# Altium footprint library PcbLib_Smart_Switchboard.PcbLib: 39 footprints (part 1 of 3)
Each footprint in its own frame and in the unit in brackets; x right, y up, seen from the top. Pads: shape width x height; smd on the part's side, far side on the other; paste and mask are expansions set on the pad; w line width, h text height; cw(c..) or ccw(c..) is an arc to the next point about the centre after c.
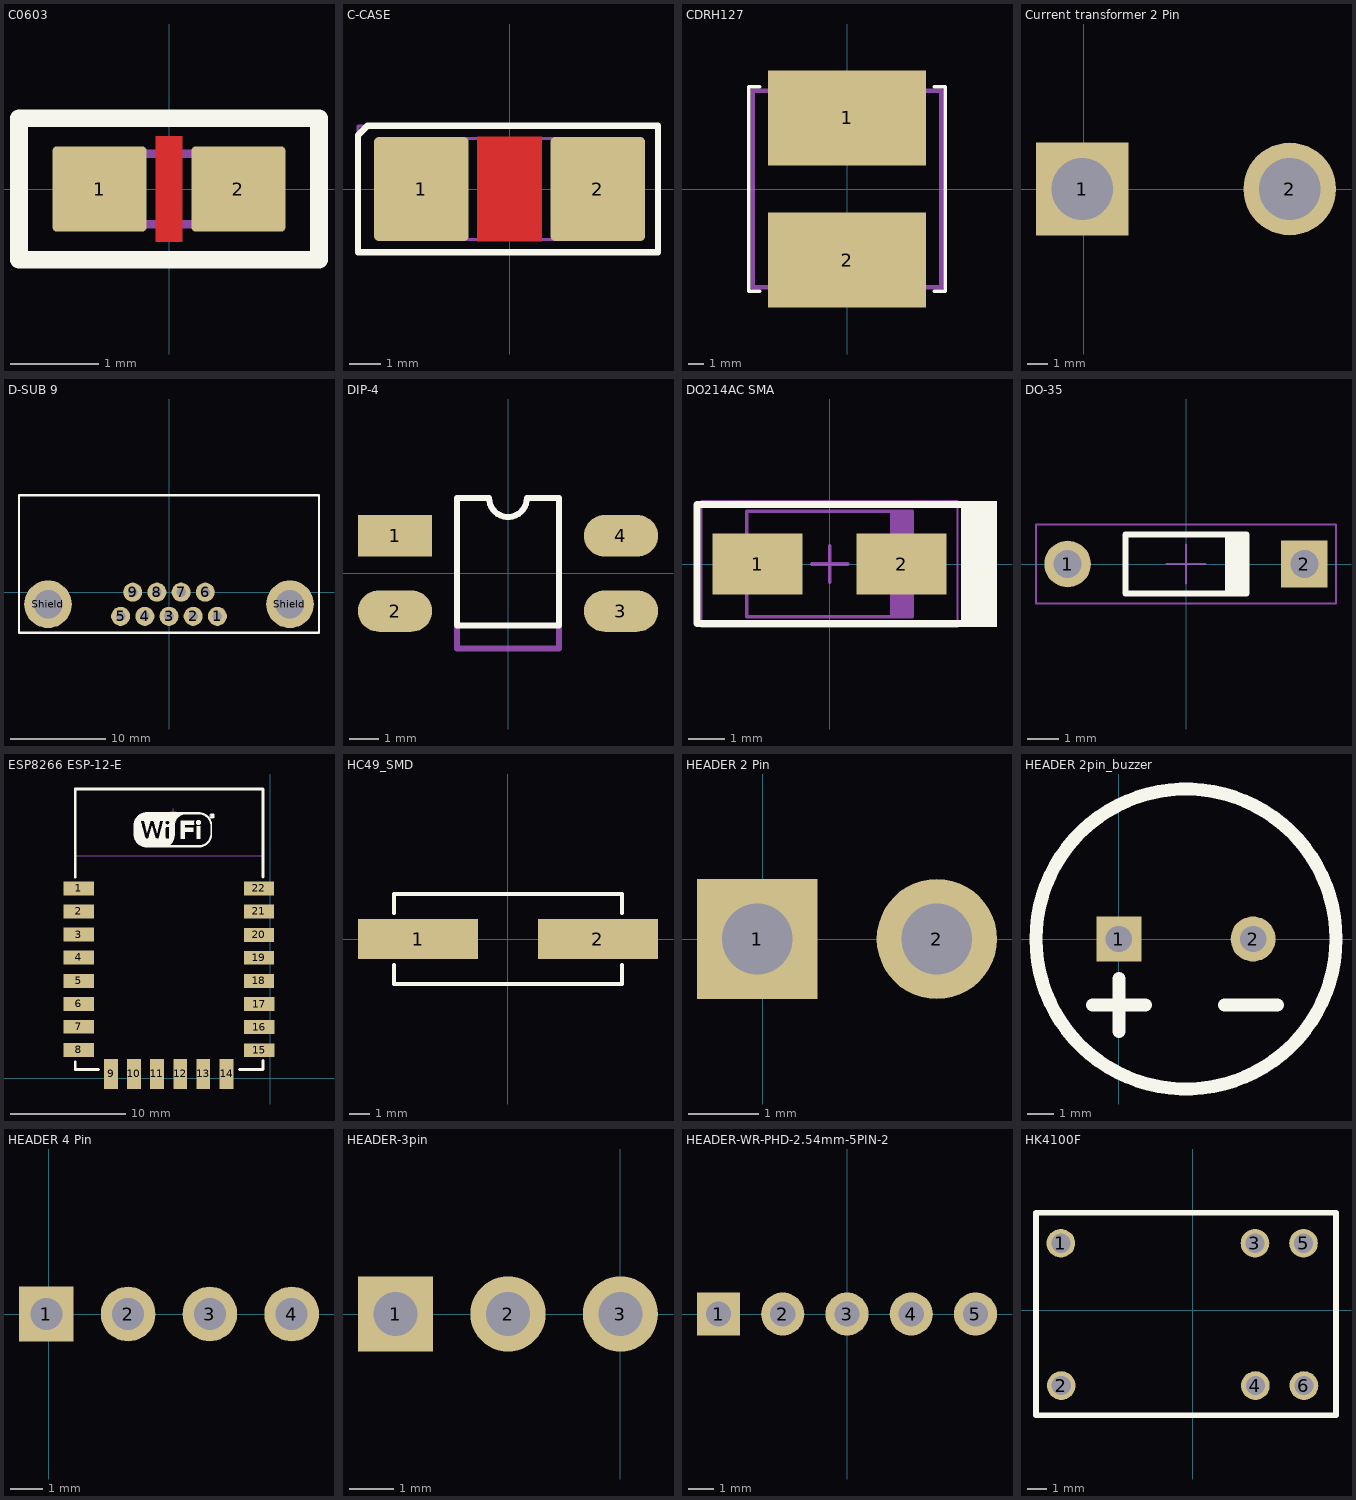
[diagram p0: the footprints below, top view; thin cyan lines are the x and y axes]

## C0603 [mil]
pads (2):
  rrect10% 42x38 smd: 1(-31,0) 2(31,0)
Top Layer:
  pour cut-out: 5.91,-23.62 5.91,23.62 -5.91,23.62 -5.91,-23.62
Top Overlay:
  lines w7.87: -66.93,-31.5 -66.93,31.5 66.93,31.5 66.93,-31.5 -66.93,-31.5
Mechanical 13:
  lines w3.94: -31.5,-15.75 31.5,-15.75 31.5,15.75 -31.5,15.75 -31.5,-15.75
Mechanical 15:
  lines w3.94: -66.93,-31.5 66.93,-31.5 66.93,31.5 -66.93,31.5 -66.93,-31.5
3D body "User Library-cap_0603-1.step": height 31.5, standoff 0, extent -31.49,-15.74 31.5,15.75

## C-CASE [mm]
pads (2):
  rrect10% 3x3.3 smd: 1(-2.794,0) 2(2.794,0)
Top Layer:
  pour cut-out: -1.025,1.65 -1.025,-1.65 1.025,-1.65 1.025,1.65
Top Overlay:
  lines w0.2: -4.8,-2 4.7,-2 4.7,2 -4.5,2 -4.8,1.7 -4.8,-2
Mechanical 13:
  lines w0.1: -2.3,-1.6 -2.3,1.6 ; -3,-1.6 3,-1.6 3,1.6 -3,1.6 -3,-1.6
Mechanical 15:
  lines w0.1: -4.8,-2 4.7,-2 4.7,2 -4.8,2 -4.8,-2
3D body "SW3dPS-cap_c.STEP": height 2.52, standoff 0.01, extent -2.997,-1.6 2.997,1.6

## CDRH127 [mm]
pads (2):
  rect 10x6 smd: 1(0,4.5) 2(0,-4.5)
Top Overlay:
  lines w0.2: -5.523,-6.477 -6.223,-6.477 -6.223,6.477 -5.523,6.477 ; 5.523,-6.477 6.223,-6.477 6.223,6.477 5.523,6.477
Mechanical 13:
  lines w0.3: -5.969,-6.223 -5.969,6.223 5.969,6.223 5.969,-6.223 -5.969,-6.223
  text ".Designator" at -4.572,-0.889 h2.5
3D body "SUMIDA-CDRH127-DEFAULT.STEP": height 7.5, standoff 0.05, extent -6,-6.171 6,6.171

## Current transformer 2 Pin [mm]
pads (2):
  rect 4.5x4.5 hole 3: 1(-0.08,0)
  round 4.5 hole 3: 2(10,0)

## D-SUB 9 [mm]
pads (11):
  round 2 hole 1: 1(5.08,-2.54) 2(2.54,-2.54) 3(0,-2.54) 4(-2.54,-2.54) 5(-5.08,-2.54) 6(3.81,0) 7(1.27,0) 8(-1.27,0) 9(-3.81,0)
  round 5 hole 3: Shield(-12.7,-1.27) Shield(12.7,-1.27)
Top Overlay:
  lines w0.254: -15.75,-4.25 -15.75,10.16 15.75,10.16 15.75,-4.25 -15.75,-4.25

## DIP-4 [mm]
pads (4):
  rect 2.5x1.4 smd: 1(-3.81,1.27)
  oval 2.5x1.4 smd: 2(-3.81,-1.27) 3(3.81,-1.27) 4(3.81,1.27)
Top Overlay:
  lines w0.2: -1.725,-1.75 -1.725,2.54 -0.635,2.54 ccw(c0,2.54) 0.635,2.54 1.725,2.54 1.725,-1.75 -1.725,-1.75
Mechanical 13:
  lines w0.2: -1.725,-2.54 -1.725,2.54 -0.635,2.54 ccw(c0,2.54) 0.635,2.54 1.725,2.54 1.725,-2.54 -1.725,-2.54
  text ".Designator" at -1.397,-0.762 h1.52
3D body "20590.stp": height 4.65, standoff -2.3, extent -4.4,-2.29 4.4,2.29

## DO214AC SMA [mm] "Molded Diode, 2-Leads, Body 4.30x2.60mm, IPC Medium Density"
height 2.4
pads (2):
  rect 2.5x1.7 smd: 1(-2,0) 2(2,0)
Top Overlay:
  rectangle: 3.65,-1.75 4.65,1.75
  lines w0.2: -3.683,1.175 -3.683,1.651 ; -3.683,1.651 3.75,1.651 3.75,0.254 3.75,-0.254 3.75,-1.651 -3.683,-1.651 -3.683,1.651
Mechanical 13:
  rectangle: 1.681,-1.46 2.3,1.46
  lines w0.1: -2.3,-1.46 -2.3,1.46 2.3,1.46 2.3,-1.46 -2.3,-1.46
Mechanical 15:
  lines w0.05: -3.556,-1.75 -3.556,1.75 3.556,1.75 3.556,-1.75 -3.556,-1.75
  lines w0.1: -0.5,0 0.5,0 ; 0,-0.5 0,0.5
3D body "SMA.STEP": height 2.4, standoff 0, extent -2.6,-1.375 2.6,1.375

## DO-35 [mm] "Diode, Axial; Body 3.8 x 1.9 mm (LxDia. max), Lead Dia. 0.53 mm (max)"
height 1.9
pads (2):
  round 1.5 hole 0.9: 1(-3.81,0)
  rect 1.5x1.5 hole 0.9: 2(3.81,0)
Top Overlay:
  rectangle: 1.25,-0.95 2.05,0.95
  lines w0.2: 1.95,-0.95 -1.95,-0.95 -1.95,0.95 1.95,0.95
Mechanical 15:
  lines w0.05: -0.635,0 0.635,0 ; 0,-0.635 0,0.635 ; -4.826,-1.27 -4.826,1.27 4.826,1.27 4.826,-1.27 -4.826,-1.27
3D body "User Library-DO-35.step": height 1.98, standoff -2.43, extent -4.09,-0.96 4.09,0.96

## ESP8266 ESP-12-E [mm] "ESP8266 ESP-12-E"
pads (22):
  rect 2.6x1.2 smd mask+0: 1(-16.586,16.408) 2(-16.586,14.427) 3(-16.586,12.421) 4(-16.586,10.439) 5(-16.586,8.407) 6(-16.586,6.426) 7(-16.586,4.445) 8(-16.586,2.438) 15(-0.965,2.413) 16(-0.965,4.42) 17(-0.965,6.401) 18(-0.991,8.407) 19(-0.991,10.414) 20(-0.991,12.395) 21(-0.991,14.427) 22(-0.991,16.408)
  rect 1.2x2.6 smd mask+0: 9(-13.792,0.356) 10(-11.811,0.356) 11(-9.83,0.356) 12(-7.798,0.356) 13(-5.817,0.356) 14(-3.785,0.356)
Top Overlay:
  drawing of 1267 lines, arcs and shapes, not listed
  text ".Designator" at -17.247,-2.134 h1
Mechanical 13:
  lines w0.051: -16.839,19.252 -0.583,19.252
  text "CUTOUT POLYGON" at -16.585,23.891 h0.25
  text "ANTENNA AREA" at -16.585,24.399 h0.25
Mechanical 15:
  lines w0.1: -8.661,23.061 -8.153,23.061 ; -8.407,22.807 -8.407,23.315
3D body "User Library-ESP_12_E.STEP": height 2.18, standoff -0.03, extent -16.789,0.929 -0.789,24.929

## HC49_SMD [mm]
height 4.5
pads (2):
  rect 6x2 smd: 1(-4.5,0) 2(4.5,0)
Top Overlay:
  lines w0.2: -5.7,-1.3 -5.7,-2.25 5.7,-2.25 5.7,-1.3 ; -5.7,1.3 -5.7,2.25 5.7,2.25 5.7,1.3
3D body "User Library-HC49_SMDHC49SMD B.STEP": height 4.3, standoff 0, extent -6.15,-2.25 6.15,2.25

## HEADER 2 Pin [mm]
pads (2):
  rect 1.7x1.7 hole 1: 1(-0.08,0)
  round 1.7 hole 1: 2(2.46,0)

## HEADER 2pin_buzzer [mm]
pads (2):
  rect 1.7x1.7 hole 1: 1(0,0)
  round 1.7 hole 1: 2(5.08,0)
Top Overlay:
  circle w0.5: c2.54,0 r5.68
  lines w0.5: -1,-2.5 1,-2.5 ; 0,-3.5 0,-1.5 ; 4,-2.5 6,-2.5

## HEADER 4 Pin [mm]
pads (4):
  rect 1.7x1.7 hole 1: 1(-0.08,0)
  round 1.7 hole 1: 2(2.46,0) 3(5,0) 4(7.54,0)

## HEADER-3pin [mm]
pads (3):
  rect 1.7x1.7 hole 1: 1(-5.08,0)
  round 1.7 hole 1: 2(-2.54,0) 3(0,0)

## HEADER-WR-PHD-2.54mm-5PIN-2 [mm]
pads (5):
  rect 1.7x1.7 hole 1: 1(-5.08,0)
  round 1.7 hole 1: 2(-2.54,0) 3(0,0) 4(2.54,0) 5(5.08,0)
3D body "HEADER-WR-PHD-2.54mm-5PIN.stp": height 8.54, standoff -3, extent -6.35,-1.27 6.35,1.27

## HK4100F [mm]
pads (6):
  round 1.5 hole 1 mask+0: 1(-6.9,3.5) 2(-6.877,-3.946) 3(3.26,3.5) 4(3.283,-3.946) 5(5.8,3.5) 6(5.823,-3.946)
Top Overlay:
  lines w0.3: -8.2,-5.5 7.5,-5.5 7.5,5.1 -8.2,5.1 -8.2,-5.5